# Altium footprint library PcbLibLafe.PcbLib: 294 footprints (part 15 of 19)
Each footprint in its own frame and in the unit in brackets; x right, y up, seen from the top. Pads: shape width x height; smd on the part's side, far side on the other; paste and mask are expansions set on the pad; w line width, h text height; cw(c..) or ccw(c..) is an arc to the next point about the centre after c.
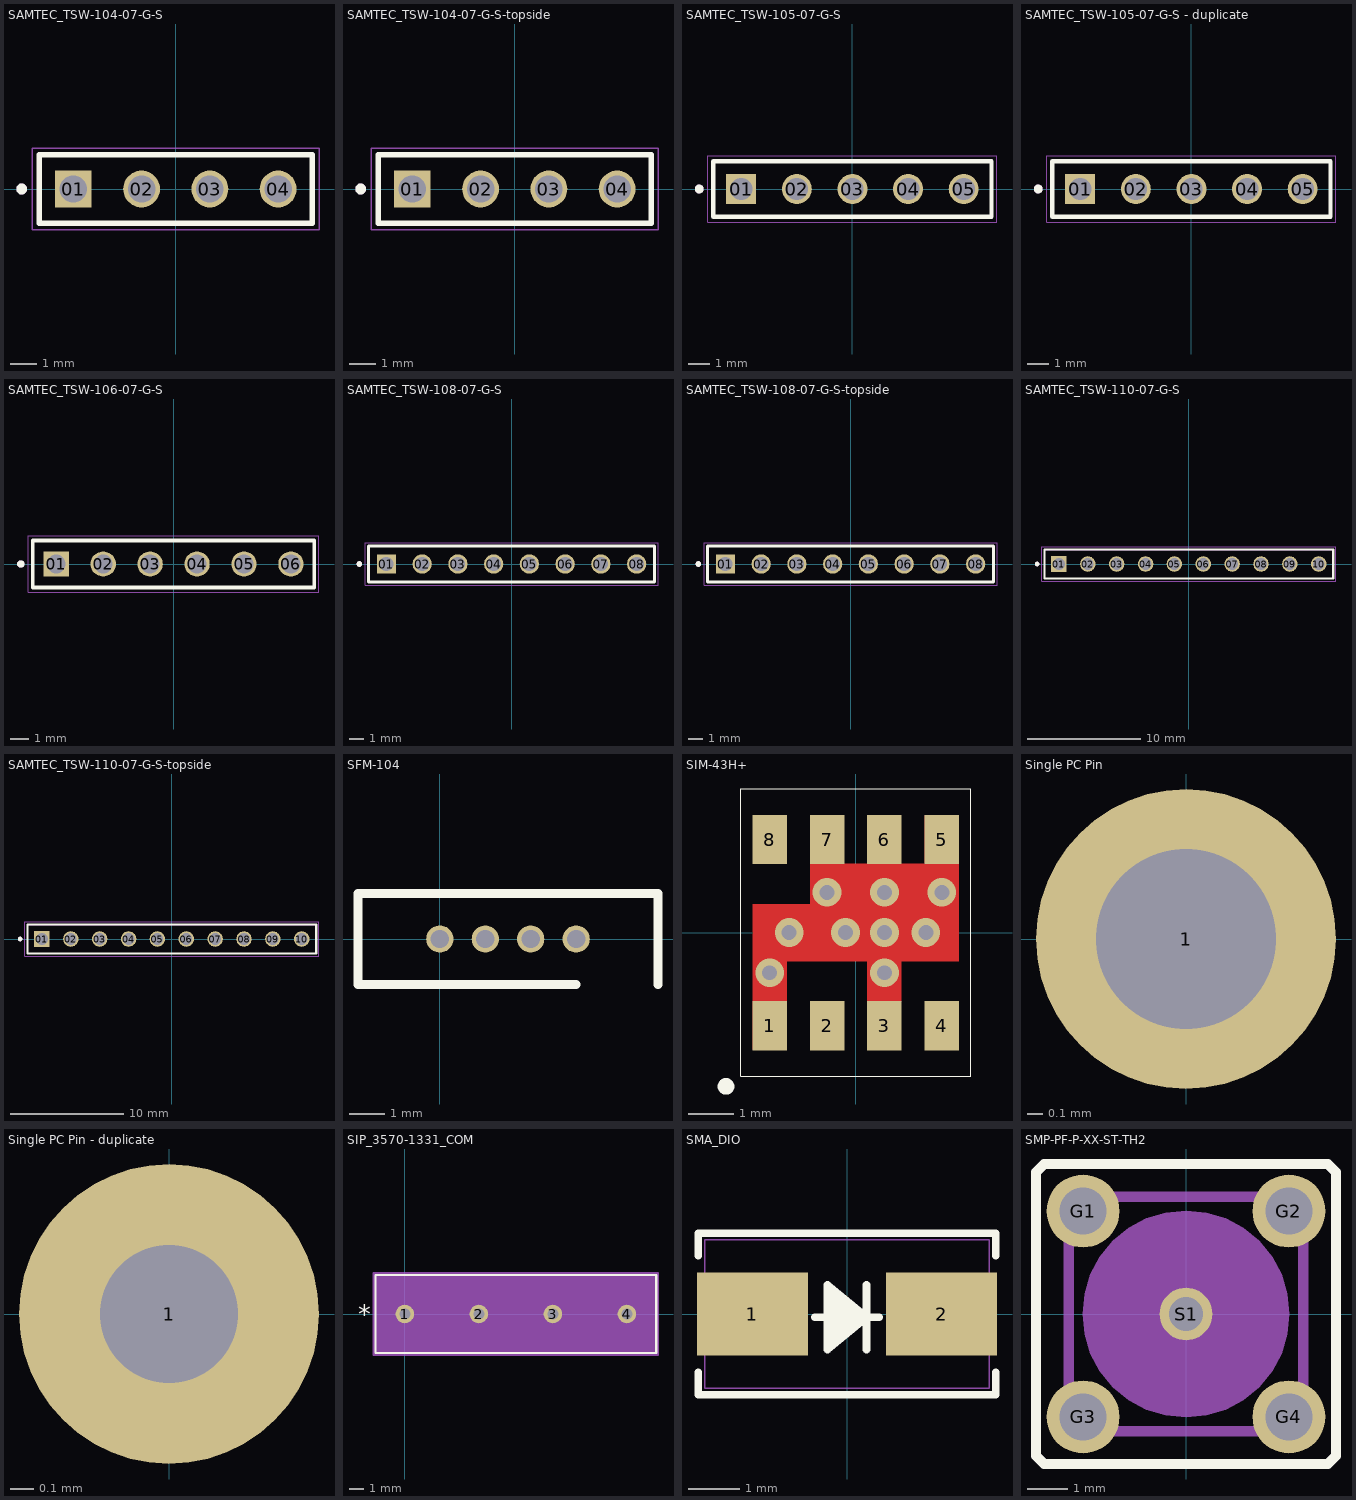
[diagram p14: the footprints below, top view; thin cyan lines are the x and y axes]

## SAMTEC_TSW-104-07-G-S [mm]
pads (4):
  rect 1.37x1.37 / inner round 1.37 / far side rect 1.37x1.37 hole 1.02: 01(-3.81,0)
  round 1.37 hole 1.02: 02(-1.27,0) 03(1.27,0) 04(3.81,0)
Top Overlay:
  circle w0.2: c-5.73,0 r0.1
  lines w0.2: -5.08,-1.27 -5.08,1.27 5.08,1.27 5.08,-1.27 -5.08,-1.27
Mechanical 13:
  circle w0.2: c-5.73,0 r0.1
  lines w0.1: -5.08,-1.27 -5.08,1.27 ; -5.08,-1.27 5.08,-1.27 ; -5.08,-1.27 -5.08,1.27 ; -5.08,1.27 5.08,1.27 ; -5.08,1.27 5.08,1.27 ; 5.08,-1.27 5.08,1.27 ; 5.08,-1.27 5.08,1.27
Mechanical 15:
  lines w0.05: -5.33,-1.52 -5.33,1.52 5.33,1.52 5.33,-1.52 -5.33,-1.52

## SAMTEC_TSW-104-07-G-S-topside [mm]
pads (4):
  rect 1.37x1.37 / inner round 1.37 / far side rect 1.37x1.37 hole 1.02: 01(-3.81,0)
  round 1.37 hole 1.02: 02(-1.27,0) 03(1.27,0) 04(3.81,0)
Top Overlay:
  circle w0.2: c-5.73,0 r0.1
  lines w0.2: -5.08,-1.27 5.08,-1.27 5.08,1.27 -5.08,1.27 -5.08,-1.27
Mechanical 13:
  circle w0.2: c-5.73,0 r0.1
  lines w0.1: -5.08,-1.27 -5.08,1.27 ; -5.08,-1.27 5.08,-1.27 ; -5.08,-1.27 -5.08,1.27 ; -5.08,1.27 5.08,1.27 ; -5.08,1.27 5.08,1.27 ; 5.08,-1.27 5.08,1.27 ; 5.08,-1.27 5.08,1.27
Mechanical 15:
  lines w0.05: -5.33,-1.52 5.33,-1.52 5.33,1.52 -5.33,1.52 -5.33,-1.52
3D body "TSW-104-07-G-S.stp": height 8.38, standoff -2.54, extent -5.207,-1.27 5.08,1.27

## SAMTEC_TSW-105-07-G-S [mm]
pads (5):
  rect 1.37x1.37 hole 1.02: 01(-5.08,0)
  round 1.37 hole 1.02: 02(-2.54,0) 03(0,0) 04(2.54,0) 05(5.08,0)
Top Overlay:
  circle w0.2: c-7,0 r0.1
  lines w0.2: -6.35,-1.27 6.35,-1.27 6.35,1.27 -6.35,1.27 -6.35,-1.27
Mechanical 13:
  circle w0.2: c-7,0 r0.1
  lines w0.1: -6.35,-1.27 -6.35,1.27 ; -6.35,-1.27 6.35,-1.27 ; -6.35,-1.27 -6.35,1.27 ; -6.35,1.27 6.35,1.27 ; -6.35,1.27 6.35,1.27 ; 6.35,-1.27 6.35,1.27 ; 6.35,-1.27 6.35,1.27
Mechanical 15:
  lines w0.05: -6.6,-1.52 6.6,-1.52 6.6,1.52 -6.6,1.52 -6.6,-1.52
3D body "TSW-105-07-G-S.stp": height 1.44, standoff -9.48, extent -6.477,-1.27 6.35,1.27

## SAMTEC_TSW-105-07-G-S - duplicate [mm]
pads (5):
  rect 1.37x1.37 hole 1.02: 01(-5.08,0)
  round 1.37 hole 1.02: 02(-2.54,0) 03(0,0) 04(2.54,0) 05(5.08,0)
Top Overlay:
  circle w0.2: c-7,0 r0.1
  lines w0.2: -6.35,-1.27 6.35,-1.27 6.35,1.27 -6.35,1.27 -6.35,-1.27
Mechanical 13:
  circle w0.2: c-7,0 r0.1
  lines w0.1: -6.35,-1.27 -6.35,1.27 ; -6.35,-1.27 6.35,-1.27 ; -6.35,-1.27 -6.35,1.27 ; -6.35,1.27 6.35,1.27 ; -6.35,1.27 6.35,1.27 ; 6.35,-1.27 6.35,1.27 ; 6.35,-1.27 6.35,1.27
Mechanical 15:
  lines w0.05: -6.6,-1.52 6.6,-1.52 6.6,1.52 -6.6,1.52 -6.6,-1.52

## SAMTEC_TSW-106-07-G-S [mm]
pads (6):
  rect 1.37x1.37 hole 1.02: 01(-6.35,0)
  round 1.37 hole 1.02: 02(-3.81,0) 03(-1.27,0) 04(1.27,0) 05(3.81,0) 06(6.35,0)
Top Overlay:
  circle w0.2: c-8.27,0 r0.1
  lines w0.2: -7.62,-1.27 7.62,-1.27 7.62,1.27 -7.62,1.27 -7.62,-1.27
Mechanical 13:
  circle w0.2: c-8.27,0 r0.1
  lines w0.1: -7.62,-1.27 -7.62,1.27 ; -7.62,-1.27 7.62,-1.27 ; -7.62,-1.27 -7.62,1.27 ; -7.62,1.27 7.62,1.27 ; -7.62,1.27 7.62,1.27 ; 7.62,-1.27 7.62,1.27 ; 7.62,-1.27 7.62,1.27
Mechanical 15:
  lines w0.05: -7.87,-1.52 7.87,-1.52 7.87,1.52 -7.87,1.52 -7.87,-1.52
3D body "TSW-106-07-G-S.stp": height 1.34, standoff -9.58, extent -7.683,-1.315 7.683,1.225

## SAMTEC_TSW-108-07-G-S [mm]
pads (8):
  rect 1.37x1.37 / inner round 1.37 / far side rect 1.37x1.37 hole 1.02: 01(-8.89,0)
  round 1.37 hole 1.02: 02(-6.35,0) 03(-3.81,0) 04(-1.27,0) 05(1.27,0) 06(3.81,0) 07(6.35,0) 08(8.89,0)
Top Overlay:
  circle w0.2: c-10.81,0 r0.1
  lines w0.2: -10.16,-1.27 -10.16,1.27 10.16,1.27 10.16,-1.27 -10.16,-1.27
Mechanical 13:
  circle w0.2: c-10.81,0 r0.1
  lines w0.1: -10.16,-1.27 -10.16,1.27 ; -10.16,-1.27 10.16,-1.27 ; -10.16,-1.27 -10.16,1.27 ; -10.16,1.27 10.16,1.27 ; -10.16,1.27 10.16,1.27 ; 10.16,-1.27 10.16,1.27 ; 10.16,-1.27 10.16,1.27
Mechanical 15:
  lines w0.05: -10.41,-1.52 -10.41,1.52 10.41,1.52 10.41,-1.52 -10.41,-1.52
3D body "TSW-108-07-G-S.stp": height 1.34, standoff -9.58, extent -10.249,-1.34 10.198,1.2

## SAMTEC_TSW-108-07-G-S-topside [mm]
pads (8):
  rect 1.37x1.37 / inner round 1.37 / far side rect 1.37x1.37 hole 1.02: 01(-8.89,0)
  round 1.37 hole 1.02: 02(-6.35,0) 03(-3.81,0) 04(-1.27,0) 05(1.27,0) 06(3.81,0) 07(6.35,0) 08(8.89,0)
Top Overlay:
  circle w0.2: c-10.81,0 r0.1
  lines w0.2: -10.16,-1.27 10.16,-1.27 10.16,1.27 -10.16,1.27 -10.16,-1.27
Mechanical 13:
  circle w0.2: c-10.81,0 r0.1
  lines w0.1: -10.16,-1.27 -10.16,1.27 ; -10.16,-1.27 10.16,-1.27 ; -10.16,-1.27 -10.16,1.27 ; -10.16,1.27 10.16,1.27 ; -10.16,1.27 10.16,1.27 ; 10.16,-1.27 10.16,1.27 ; 10.16,-1.27 10.16,1.27
Mechanical 15:
  lines w0.05: -10.41,-1.52 10.41,-1.52 10.41,1.52 -10.41,1.52 -10.41,-1.52
3D body "TSW-108-07-G-S.stp": height 8.38, standoff -2.54, extent -10.249,-1.34 10.198,1.2

## SAMTEC_TSW-110-07-G-S [mm]
pads (10):
  rect 1.37x1.37 / inner round 1.37 / far side rect 1.37x1.37 hole 1.02: 01(-11.43,0)
  round 1.37 hole 1.02: 02(-8.89,0) 03(-6.35,0) 04(-3.81,0) 05(-1.27,0) 06(1.27,0) 07(3.81,0) 08(6.35,0) 09(8.89,0) 10(11.43,0)
Top Overlay:
  circle w0.2: c-13.35,0 r0.1
  lines w0.2: -12.7,-1.27 12.7,-1.27 12.7,1.27 -12.7,1.27 -12.7,-1.27
Mechanical 13:
  circle w0.2: c-13.35,0 r0.1
  lines w0.1: -12.7,-1.27 -12.7,1.27 ; -12.7,-1.27 12.7,-1.27 ; -12.7,-1.27 -12.7,1.27 ; -12.7,1.27 12.7,1.27 ; -12.7,1.27 12.7,1.27 ; 12.7,-1.27 12.7,1.27 ; 12.7,-1.27 12.7,1.27
Mechanical 15:
  lines w0.05: -12.95,-1.52 12.95,-1.52 12.95,1.52 -12.95,1.52 -12.95,-1.52
3D body "TSW-110-07-G-S.stp": height 1.34, standoff -9.58, extent -12.752,-1.295 12.775,1.245

## SAMTEC_TSW-110-07-G-S-topside [mm]
pads (10):
  rect 1.37x1.37 / inner round 1.37 / far side rect 1.37x1.37 hole 1.02: 01(-11.43,0)
  round 1.37 hole 1.02: 02(-8.89,0) 03(-6.35,0) 04(-3.81,0) 05(-1.27,0) 06(1.27,0) 07(3.81,0) 08(6.35,0) 09(8.89,0) 10(11.43,0)
Top Overlay:
  circle w0.2: c-13.35,0 r0.1
  lines w0.2: -12.7,-1.27 -12.7,1.27 12.7,1.27 12.7,-1.27 -12.7,-1.27
Mechanical 13:
  circle w0.2: c-13.35,0 r0.1
  lines w0.1: -12.7,-1.27 -12.7,1.27 ; -12.7,-1.27 12.7,-1.27 ; -12.7,-1.27 -12.7,1.27 ; -12.7,1.27 12.7,1.27 ; -12.7,1.27 12.7,1.27 ; 12.7,-1.27 12.7,1.27 ; 12.7,-1.27 12.7,1.27
Mechanical 15:
  lines w0.05: -12.95,-1.52 -12.95,1.52 12.95,1.52 12.95,-1.52 -12.95,-1.52
3D body "TSW-110-07-G-S.stp": height 8.38, standoff -2.54, extent -12.752,-1.295 12.775,1.245

## SFM-104 [mil] "Samtec 4 pin thru hole"
pads (4):
  round 30 hole 20: ""(0,0) ""(50,0) ""(100,0) ""(150,0)
Top Overlay:
  lines w10: 150,-50 -90,-50 -90,50 240,50 240,-50

## SIM-43H+ [mil]
pads (8):
  rect 30x43 smd: 1(-75,-81) 2(-25,-81) 3(25,-81) 4(75,-81) 5(75,81) 6(25,81) 7(-25,81) 8(-75,81)
via -25,35 diameter 25 hole 13
via 25,35 diameter 25 hole 13
via 75,35 diameter 25 hole 13
via 25,0 diameter 25 hole 13
via 61,0 diameter 25 hole 13
via -9,0 diameter 25 hole 13
via 25,-35 diameter 25 hole 13
via -75,-35 diameter 25 hole 13
via -58,0 diameter 25 hole 13
Top Layer:
  rectangle: -40,14 89,60
  rectangle: -90,-25 90,25
  rectangle: 10,-60 40,-23
  rectangle: 60,-25 90,102
  rectangle: -90,-102 -60,25
Top Overlay:
  circle w10: c-113,-134 r2.24
  lines w1: -100,-125 100,-125 100,125 -100,125 -100,-125
Top Solder:
  rectangle: -90,-16 -75,25
  rectangle: -90,12 -25,25
  rectangle: -39,-25 -25,17
  rectangle: -39,-25 10,-14
  rectangle: 40,-25 90,-12
  rectangle: 75,-14 90,22

## Single PC Pin [mil]
pads (1):
  round 75 hole 45: 1(0,0)

## Single PC Pin - duplicate [mil]
pads (1):
  round 50 hole 23: 1(0,0)

## SIP_3570-1331_COM [mil]
pads (4):
  round 50 / inner round 60 / far side round 50 hole 30 paste-99999 mask+0: 1(0,0) 2(200,0) 3(400,0) 4(600,0)
Top Overlay:
  lines w6: -79,-105 679,-105 679,105 -79,105 -79,-105
  text "*" at -126.5,-25 h50
Mechanical 13:
  lines w1: -74,-100 674,-100 674,100 -74,100 -74,-100
  text "*" at -76.5,-25 h50
Mechanical 15:
  region: 684,-110 -84,-110 -84,110 684,110
  lines w6: -84,-110 -84,110 684,110 684,-110 -84,-110
3D body "SIP_3570-1331_COM.step": height 130, standoff -352.99, extent -74.02,-100 674.02,100

## SMA_DIO [mm]
height 2.032
pads (2):
  rect 2.18x1.63 smd paste+0 mask+0: 1(-1.857,0) 2(1.857,0)
Top Overlay:
  lines w0.152: -2.922,-1.148 -2.922,-1.587 2.922,-1.587 2.922,-1.148 ; -2.922,1.148 -2.922,1.587 2.922,1.587 2.922,1.148 ; -0.635,-0.064 0.635,-0.064 ; -0.381,-0.572 0.381,-0.064 ; -0.381,-0.445 0.381,-0.064 ; -0.381,-0.318 0.381,-0.064 ; -0.381,-0.191 0.381,-0.064 ; -0.381,0.064 0.381,-0.064 ; -0.381,0.191 0.381,-0.064 ; -0.381,0.318 0.381,-0.064 ; -0.381,0.445 0.381,-0.064 ; 0.381,-0.699 0.381,0.572 ; 0.381,-0.064 -0.381,0.572 -0.381,-0.699 0.381,-0.064
Mechanical 13:
  lines w0.025: -0.635,-0.064 0.635,-0.064 ; -0.381,-0.572 0.381,-0.064 ; -0.381,-0.445 0.381,-0.064 ; -0.381,-0.318 0.381,-0.064 ; -0.381,-0.191 0.381,-0.064 ; -0.381,0.064 0.381,-0.064 ; -0.381,0.191 0.381,-0.064 ; -0.381,0.318 0.381,-0.064 ; -0.381,0.445 0.381,-0.064 ; 0.381,-0.699 0.381,0.572 ; 0.381,-0.064 -0.381,0.572 -0.381,-0.699 0.381,-0.064 ; -2.795,-1.46 2.795,-1.46 2.795,1.46 -2.795,1.46 -2.795,-1.46
3D body "SMA_DIO.step": height 2.35, standoff 0, extent -2.795,-1.46 2.795,1.46

## SMP-PF-P-XX-ST-TH2 [mm]
pads (5):
  round 1.8 hole 1.17 mask+0.075: G1(-2.54,2.54) G2(2.54,2.54) G3(-2.54,-2.54) G4(2.54,-2.54)
  round 1.3 hole 0.85 mask+0.075: S1(0,0)
Top Overlay:
  lines w0.254: -3.7,-3.5 -3.5,-3.7 3.5,-3.7 3.7,-3.5 3.7,3.5 3.5,3.7 -3.5,3.7 -3.7,3.5 -3.7,-3.5
Mechanical 1:
  lines w0.254: -2.89,-2.89 2.89,-2.89 2.89,2.89 -2.89,2.89 -2.89,-2.89
  text "J1" at -0.497,4.192 h0.76
Mechanical 3:
  pour cut-out: 2.552,0 2.503,0.498 2.358,0.977 2.122,1.418 1.805,1.805 1.418,2.122 0.977,2.358 0.498,2.503 0,2.552 -0.498,2.503 -0.977,2.358 -1.418,2.122 -1.805,1.805 -2.122,1.418 -2.358,0.977 -2.503,0.498 -2.552,0 -2.503,-0.498 -2.358,-0.977 -2.122,-1.418 -1.805,-1.805 -1.418,-2.122 -0.977,-2.358 -0.498,-2.503 0,-2.552 0.498,-2.503 0.977,-2.358 1.418,-2.122 1.805,-1.805 2.122,-1.418 2.358,-0.977 2.503,-0.498